# Altium footprint library CryptLib.PcbLib: 52 footprints (part 2 of 4)
Each footprint in its own frame and in the unit in brackets; x right, y up, seen from the top. Pads: shape width x height; smd on the part's side, far side on the other; paste and mask are expansions set on the pad; w line width, h text height; cw(c..) or ccw(c..) is an arc to the next point about the centre after c.
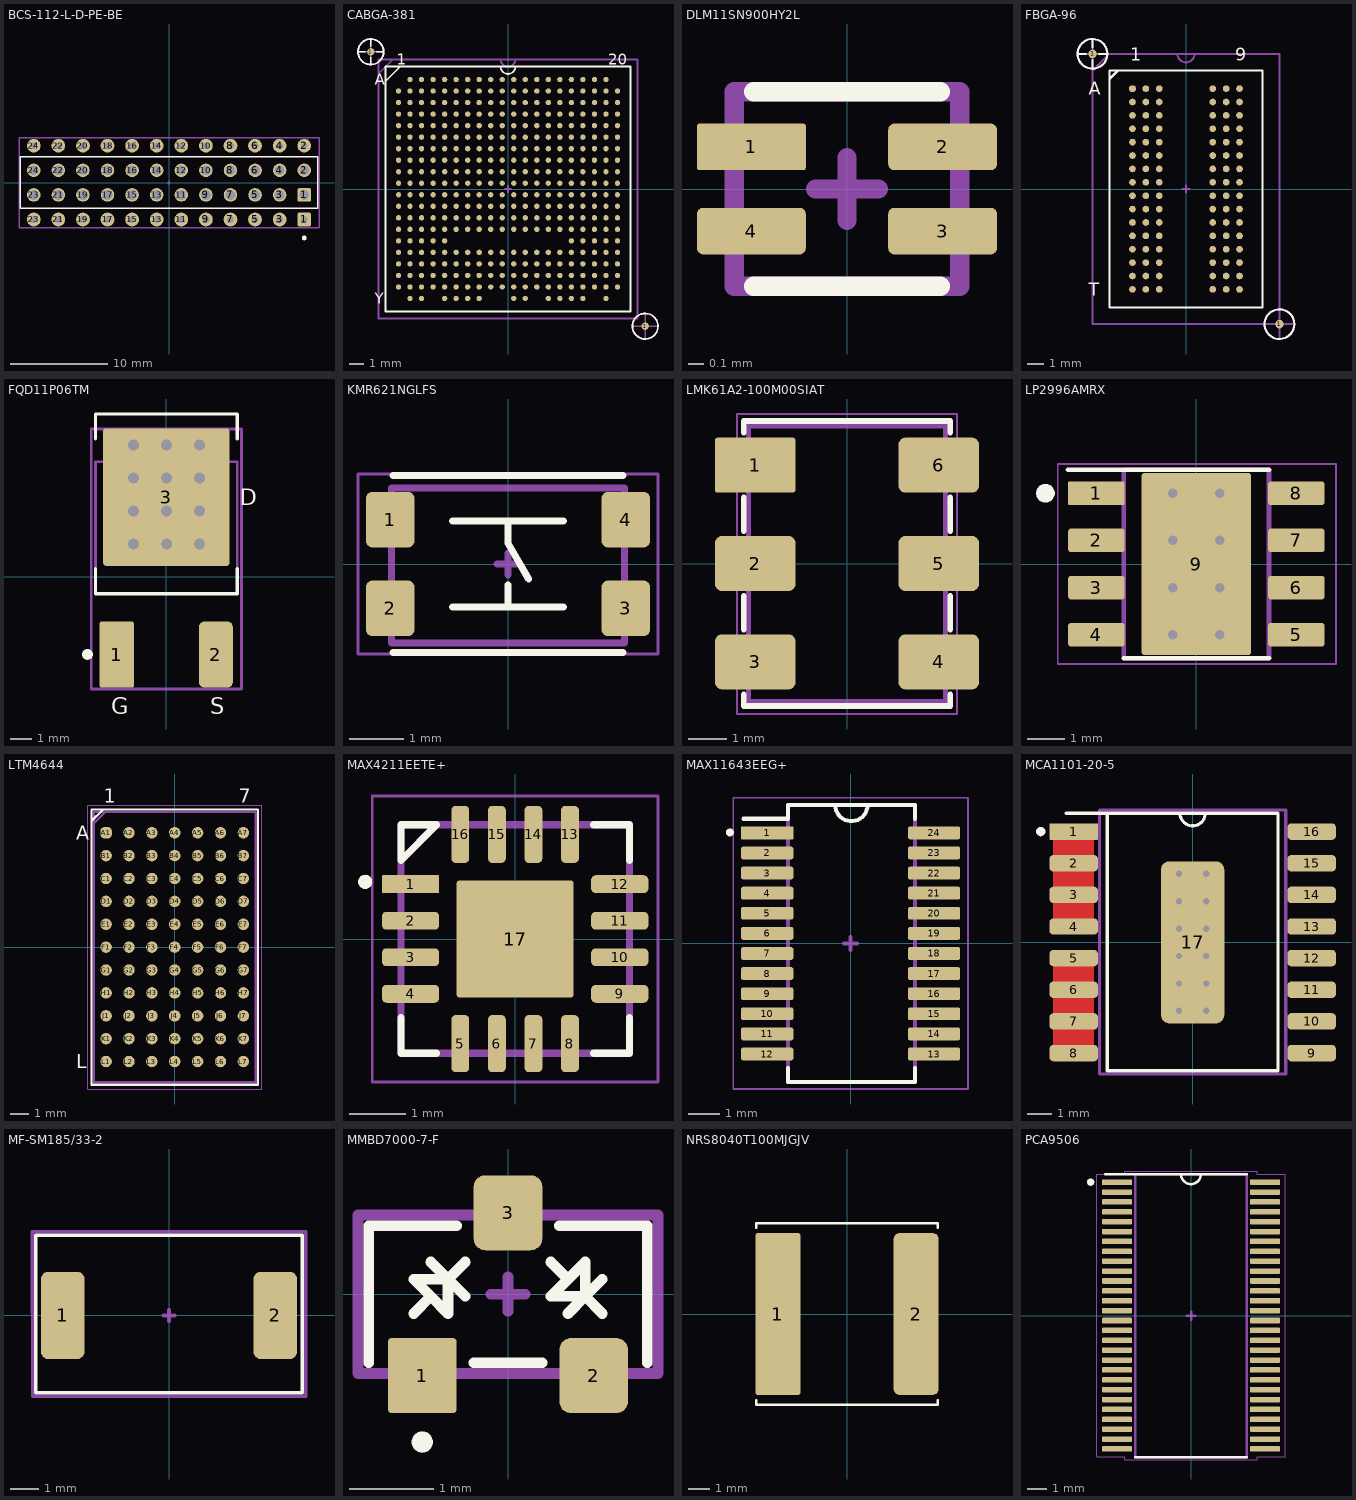
[diagram p1: the footprints below, top view; thin cyan lines are the x and y axes]

## BCS-112-L-D-PE-BE [mil]
pads (50):
  rrect25% 56x56 hole 28 mask+0: 1(550,-150)
  rrect25% 55x55 hole 40 mask+0: 1(550,-50)
  round 55 / inner round 40 / far side round 40 hole 40 mask+0: 2(550,50) 3(450,-50) 4(450,50) 5(350,-50) 6(350,50) 7(250,-50) 8(250,50) 9(150,-50) 10(150,50) 11(50,-50) 12(50,50) 13(-50,-50) 14(-50,50) 15(-150,-50) 16(-150,50) 17(-250,-50) 18(-250,50) 19(-350,-50) 20(-350,50) 21(-450,-50) 22(-450,50) 23(-550,-50) 24(-550,50)
  round 56 / inner round 50 / far side round 50 hole 28 mask+0: 2(550,150) 3(450,-150) 4(450,150) 5(350,-150) 6(350,150) 7(250,-150) 8(250,150) 9(150,-150) 10(150,150) 11(50,-150) 12(50,150) 13(-50,-150) 14(-50,150) 15(-150,-150) 16(-150,150) 17(-250,-150) 18(-250,150) 19(-350,-150) 20(-350,150) 21(-450,-150) 22(-450,150) 23(-550,-150) 24(-550,150)
  round 20 on Top Overlay: ""(550,-225)
  round 7.5 on Mech8: ""(550,-150)
Top Overlay:
  lines w6: -605,-105 -605,105 605,105 605,-105 -605,-105
Top Designator:
  text "'.Designator'" at -113.3,-8.33 h20
Top Assembly:
  lines w5: -8,0 8,0 ; 0,-8 0,8
  lines w6: -610,-183 610,-183 610,183 -610,183 -610,-183
3D body "BCS-112-L-D-PE-BE.stp": height 293.5, standoff -127.5, extent -600.01,-155 599.99,155

## CABGA-381 [mm]
pads (383):
  round 0.508 smd paste-25.375 mask+0.508: 1(-9.525,9.525) 1(9.525,-9.525)
  round 0.37 smd paste-25.375: A2(-6.8,7.6) A3(-6,7.6) A4(-5.2,7.6) A5(-4.4,7.6) A6(-3.6,7.6) A7(-2.8,7.6) A8(-2,7.6) A9(-1.2,7.6) A10(-0.4,7.6) A11(0.4,7.6) A12(1.2,7.6) A13(2,7.6) A14(2.8,7.6) A15(3.6,7.6) A16(4.4,7.6) A17(5.2,7.6) A18(6,7.6) A19(6.8,7.6) B1(-7.6,6.8) B2(-6.8,6.8) B3(-6,6.8) B4(-5.2,6.8) B5(-4.4,6.8) B6(-3.6,6.8) B7(-2.8,6.8) B8(-2,6.8) B9(-1.2,6.8) B10(-0.4,6.8) B11(0.4,6.8) B12(1.2,6.8) B13(2,6.8) B14(2.8,6.8) B15(3.6,6.8) B16(4.4,6.8) B17(5.2,6.8) B18(6,6.8) B19(6.8,6.8) B20(7.6,6.8) C1(-7.6,6) C2(-6.8,6) C3(-6,6) C4(-5.2,6) C5(-4.4,6) C6(-3.6,6) C7(-2.8,6) C8(-2,6) C9(-1.2,6) C10(-0.4,6) C11(0.4,6) C12(1.2,6) C13(2,6) C14(2.8,6) C15(3.6,6) C16(4.4,6) C17(5.2,6) C18(6,6) C19(6.8,6) C20(7.6,6) D1(-7.6,5.2) D2(-6.8,5.2) D3(-6,5.2) D4(-5.2,5.2) D5(-4.4,5.2) D6(-3.6,5.2) D7(-2.8,5.2) D8(-2,5.2) D9(-1.2,5.2) D10(-0.4,5.2) D11(0.4,5.2) D12(1.2,5.2) D13(2,5.2) D14(2.8,5.2) D15(3.6,5.2) D16(4.4,5.2) D17(5.2,5.2) D18(6,5.2) D19(6.8,5.2) D20(7.6,5.2) E1(-7.6,4.4) E2(-6.8,4.4) E3(-6,4.4) E4(-5.2,4.4) E5(-4.4,4.4) E6(-3.6,4.4) E7(-2.8,4.4) E8(-2,4.4) E9(-1.2,4.4) E10(-0.4,4.4) E11(0.4,4.4) E12(1.2,4.4) E13(2,4.4) E14(2.8,4.4) E15(3.6,4.4) E16(4.4,4.4) E17(5.2,4.4) E18(6,4.4) E19(6.8,4.4) E20(7.6,4.4) F1(-7.6,3.6) F2(-6.8,3.6) F3(-6,3.6) F4(-5.2,3.6) F5(-4.4,3.6) F6(-3.6,3.6) F7(-2.8,3.6) F8(-2,3.6) F9(-1.2,3.6) F10(-0.4,3.6) F11(0.4,3.6) F12(1.2,3.6) F13(2,3.6) F14(2.8,3.6) F15(3.6,3.6) F16(4.4,3.6) F17(5.2,3.6) F18(6,3.6) F19(6.8,3.6) F20(7.6,3.6) G1(-7.6,2.8) G2(-6.8,2.8) G3(-6,2.8) G4(-5.2,2.8) G5(-4.4,2.8) G6(-3.6,2.8) G7(-2.8,2.8) G8(-2,2.8) G9(-1.2,2.8) G10(-0.4,2.8) G11(0.4,2.8) G12(1.2,2.8) G13(2,2.8) G14(2.8,2.8) G15(3.6,2.8) G16(4.4,2.8) G17(5.2,2.8) G18(6,2.8) G19(6.8,2.8) G20(7.6,2.8) H1(-7.6,2) H2(-6.8,2) H3(-6,2) H4(-5.2,2) H5(-4.4,2) H6(-3.6,2) H7(-2.8,2) H8(-2,2) H9(-1.2,2) H10(-0.4,2) H11(0.4,2) H12(1.2,2) H13(2,2) H14(2.8,2) H15(3.6,2) H16(4.4,2) H17(5.2,2) H18(6,2) H19(6.8,2) H20(7.6,2) J1(-7.6,1.2) J2(-6.8,1.2) J3(-6,1.2) J4(-5.2,1.2) J5(-4.4,1.2) J6(-3.6,1.2) J7(-2.8,1.2) J8(-2,1.2) J9(-1.2,1.2) J10(-0.4,1.2) J11(0.4,1.2) J12(1.2,1.2) J13(2,1.2) J14(2.8,1.2) J15(3.6,1.2) J16(4.4,1.2) J17(5.2,1.2) J18(6,1.2) J19(6.8,1.2) J20(7.6,1.2) K1(-7.6,0.4) K2(-6.8,0.4) K3(-6,0.4) K4(-5.2,0.4) K5(-4.4,0.4) K6(-3.6,0.4) K7(-2.8,0.4) K8(-2,0.4) K9(-1.2,0.4) K10(-0.4,0.4) K11(0.4,0.4) K12(1.2,0.4) K13(2,0.4) K14(2.8,0.4) K15(3.6,0.4) K16(4.4,0.4) K17(5.2,0.4) K18(6,0.4) K19(6.8,0.4) K20(7.6,0.4) L1(-7.6,-0.4) L2(-6.8,-0.4) L3(-6,-0.4) L4(-5.2,-0.4) L5(-4.4,-0.4) L6(-3.6,-0.4) L7(-2.8,-0.4) L8(-2,-0.4) L9(-1.2,-0.4) L10(-0.4,-0.4) L11(0.4,-0.4) L12(1.2,-0.4) L13(2,-0.4) L14(2.8,-0.4) L15(3.6,-0.4) L16(4.4,-0.4) L17(5.2,-0.4) L18(6,-0.4) L19(6.8,-0.4) L20(7.6,-0.4) M1(-7.6,-1.2) M2(-6.8,-1.2) M3(-6,-1.2) M4(-5.2,-1.2) M5(-4.4,-1.2) M6(-3.6,-1.2) M7(-2.8,-1.2) M8(-2,-1.2) M9(-1.2,-1.2) M10(-0.4,-1.2) M11(0.4,-1.2) M12(1.2,-1.2) M13(2,-1.2) M14(2.8,-1.2) M15(3.6,-1.2) M16(4.4,-1.2) M17(5.2,-1.2) M18(6,-1.2) M19(6.8,-1.2) M20(7.6,-1.2) N1(-7.6,-2) N2(-6.8,-2) N3(-6,-2) N4(-5.2,-2) N5(-4.4,-2) N6(-3.6,-2) N7(-2.8,-2) N8(-2,-2) N9(-1.2,-2) N10(-0.4,-2) N11(0.4,-2) N12(1.2,-2) N13(2,-2) N14(2.8,-2) N15(3.6,-2) N16(4.4,-2) N17(5.2,-2) N18(6,-2) N19(6.8,-2) N20(7.6,-2) P1(-7.6,-2.8) P2(-6.8,-2.8) P3(-6,-2.8) P4(-5.2,-2.8) P5(-4.4,-2.8) P6(-3.6,-2.8) P7(-2.8,-2.8) P8(-2,-2.8) P9(-1.2,-2.8) P10(-0.4,-2.8) P11(0.4,-2.8) P12(1.2,-2.8) P13(2,-2.8) P14(2.8,-2.8) P15(3.6,-2.8) P16(4.4,-2.8) P17(5.2,-2.8) P18(6,-2.8) P19(6.8,-2.8) P20(7.6,-2.8) R1(-7.6,-3.6) R2(-6.8,-3.6) R3(-6,-3.6) R4(-5.2,-3.6) R5(-4.4,-3.6) R16(4.4,-3.6) R17(5.2,-3.6) R18(6,-3.6) R19(6.8,-3.6) R20(7.6,-3.6) T1(-7.6,-4.4) T2(-6.8,-4.4) T3(-6,-4.4) T4(-5.2,-4.4) T5(-4.4,-4.4) T6(-3.6,-4.4) T7(-2.8,-4.4) T8(-2,-4.4) T9(-1.2,-4.4) T10(-0.4,-4.4) T11(0.4,-4.4) T12(1.2,-4.4) T13(2,-4.4) T14(2.8,-4.4) T15(3.6,-4.4) T16(4.4,-4.4) T17(5.2,-4.4) T18(6,-4.4) T19(6.8,-4.4) T20(7.6,-4.4) U1(-7.6,-5.2) U2(-6.8,-5.2) U3(-6,-5.2) U4(-5.2,-5.2) U5(-4.4,-5.2) U6(-3.6,-5.2) U7(-2.8,-5.2) U8(-2,-5.2) U9(-1.2,-5.2) U10(-0.4,-5.2) U11(0.4,-5.2) U12(1.2,-5.2) U13(2,-5.2) U14(2.8,-5.2) U15(3.6,-5.2) U16(4.4,-5.2) U17(5.2,-5.2) U18(6,-5.2) U19(6.8,-5.2) U20(7.6,-5.2) V1(-7.6,-6) V2(-6.8,-6) V3(-6,-6) V4(-5.2,-6) V5(-4.4,-6) V6(-3.6,-6) V7(-2.8,-6) V8(-2,-6) V9(-1.2,-6) V10(-0.4,-6) V11(0.4,-6) V12(1.2,-6) V13(2,-6) V14(2.8,-6) V15(3.6,-6) V16(4.4,-6) V17(5.2,-6) V18(6,-6) V19(6.8,-6) V20(7.6,-6) W1(-7.6,-6.8) W2(-6.8,-6.8) W3(-6,-6.8) W4(-5.2,-6.8) W5(-4.4,-6.8) W6(-3.6,-6.8) W7(-2.8,-6.8) W8(-2,-6.8) W9(-1.2,-6.8) W10(-0.4,-6.8) W11(0.4,-6.8) W12(1.2,-6.8) W13(2,-6.8) W14(2.8,-6.8) W15(3.6,-6.8) W16(4.4,-6.8) W17(5.2,-6.8) W18(6,-6.8) W19(6.8,-6.8) W20(7.6,-6.8) Y2(-6.8,-7.6) Y3(-6,-7.6) Y5(-4.4,-7.6) Y6(-3.6,-7.6) Y7(-2.8,-7.6) Y8(-2,-7.6) Y11(0.4,-7.6) Y12(1.2,-7.6) Y14(2.8,-7.6) Y15(3.6,-7.6) Y16(4.4,-7.6) Y17(5.2,-7.6) Y19(6.8,-7.6)
Top Overlay:
  circle w0.127: c9.525,-9.525 r0.889
  circle w0.127: c-9.525,9.525 r0.889
  lines w0.127: -10.414,9.525 -9.906,9.525 ; -9.525,8.636 -9.525,9.144 ; -9.525,9.906 -9.525,10.414 ; -9.144,9.525 -8.636,9.525 ; -8.5,7.5 -7.5,8.5 ; -0.508,8.5 ccw(c0,8.5) 0.508,8.5 ; -8.5,-8.5 8.5,-8.5 8.5,8.5 -8.5,8.5 -8.5,-8.5
  text "1" at -7.727,8.617 h0.76
  text "A" at -9.254,7.227 h0.76
  text "20" at 6.965,8.617 h0.76
  text "Y" at -9.254,-7.973 h0.76
Top Designator:
  text "'.Designator'" at -2.878,-0.212 h0.51
  text "'.Comment'" at -2.158,-1.515 h0.51
Top Assembly:
  circle w0.127: c9.525,-9.525 r0.889
  circle w0.127: c-9.525,9.525 r0.889
  lines w0.127: -10.414,9.525 -8.636,9.525 ; -9.525,8.636 -9.525,10.414 ; -8.992,7.992 -7.992,8.992 ; -0.508,9 ccw(c0,9) 0.508,9 ; -0.203,0 0.203,0 ; 0,-0.203 0,0.203 ; 8.636,-9.525 10.414,-9.525 ; 9.525,-10.414 9.525,-8.636 ; -9,-9 -9,9 9,9 9,-9 -9,-9
3D body "LFE5UM-45F-8BG381C.STEP": height 0.88, standoff -0.02, extent -8.5,-8.5 8.5,8.5

## DLM11SN900HY2L [mil]
pads (5):
  rrect10% 28x12 smd: 1(-24.61,10.83)
  rrect25% 28x12 smd: 2(24.61,10.83) 3(24.61,-10.83) 4(-24.61,-10.83)
  round 7.5 on Mech8: ""(-24.61,10.83)
Top Overlay:
  lines w5: -24,-25 24,-25 ; -24,25 24,25
Top Designator:
  text "'.Designator'" at -113.3,-8.33 h20
Top Assembly:
  lines w5: -8,0 8,0 ; 0,-8 0,8 ; -29,-25 29,-25 29,25 -29,25 -29,-25
3D body "DLM11SN900HY2L.STEP": height 24.12, standoff 0.5, extent -24.61,-19.68 24.6,19.69

## FBGA-96 [mm]
pads (99):
  round 0.508 smd paste-25.375 mask+0.508: 1(-5.588,8.077) 1(5.588,-8.077)
  rrect75% 0.4x0.4 smd paste-25.375: A1(-3.2,6)
  round 0.4 smd paste-25.375: A2(-2.4,6) A3(-1.6,6) A7(1.6,6) A8(2.4,6) A9(3.2,6) B1(-3.2,5.2) B2(-2.4,5.2) B3(-1.6,5.2) B7(1.6,5.2) B8(2.4,5.2) B9(3.2,5.2) C1(-3.2,4.4) C2(-2.4,4.4) C3(-1.6,4.4) C7(1.6,4.4) C8(2.4,4.4) C9(3.2,4.4) D1(-3.2,3.6) D2(-2.4,3.6) D3(-1.6,3.6) D7(1.6,3.6) D8(2.4,3.6) D9(3.2,3.6) E1(-3.2,2.8) E2(-2.4,2.8) E3(-1.6,2.8) E7(1.6,2.8) E8(2.4,2.8) E9(3.2,2.8) F1(-3.2,2) F2(-2.4,2) F3(-1.6,2) F7(1.6,2) F8(2.4,2) F9(3.2,2) G1(-3.2,1.2) G2(-2.4,1.2) G3(-1.6,1.2) G7(1.6,1.2) G8(2.4,1.2) G9(3.2,1.2) H1(-3.2,0.4) H2(-2.4,0.4) H3(-1.6,0.4) H7(1.6,0.4) H8(2.4,0.4) H9(3.2,0.4) J1(-3.2,-0.4) J2(-2.4,-0.4) J3(-1.6,-0.4) J7(1.6,-0.4) J8(2.4,-0.4) J9(3.2,-0.4) K1(-3.2,-1.2) K2(-2.4,-1.2) K3(-1.6,-1.2) K7(1.6,-1.2) K8(2.4,-1.2) K9(3.2,-1.2) L1(-3.2,-2) L2(-2.4,-2) L3(-1.6,-2) L7(1.6,-2) L8(2.4,-2) L9(3.2,-2) M1(-3.2,-2.8) M2(-2.4,-2.8) M3(-1.6,-2.8) M7(1.6,-2.8) M8(2.4,-2.8) M9(3.2,-2.8) N1(-3.2,-3.6) N2(-2.4,-3.6) N3(-1.6,-3.6) N7(1.6,-3.6) N8(2.4,-3.6) N9(3.2,-3.6) P1(-3.2,-4.4) P2(-2.4,-4.4) P3(-1.6,-4.4) P7(1.6,-4.4) P8(2.4,-4.4) P9(3.2,-4.4) R1(-3.2,-5.2) R2(-2.4,-5.2) R3(-1.6,-5.2) R7(1.6,-5.2) R8(2.4,-5.2) R9(3.2,-5.2) T1(-3.2,-6) T2(-2.4,-6) T3(-1.6,-6) T7(1.6,-6) T8(2.4,-6) T9(3.2,-6)
  round 0.191 on Mech8: ""(-3.2,6)
Top Overlay:
  circle w0.127: c5.588,-8.077 r0.889
  circle w0.127: c-5.588,8.077 r0.889
  lines w0.127: -6.477,8.077 -5.969,8.077 ; -5.588,7.188 -5.588,7.696 ; -5.588,8.458 -5.588,8.966 ; -5.207,8.077 -4.699,8.077 ; -4.572,6.579 -4.064,7.087 ; -4.572,-7.087 4.572,-7.087 4.572,7.087 -4.572,7.087 -4.572,-7.087
  text "A" at -5.804,5.627 h0.76
  text "1" at -3.327,7.667 h0.76
  text "T" at -5.804,-6.383 h0.76
  text "9" at 2.946,7.667 h0.76
Top Designator:
  text "'.Comment'" at -2.158,-1.541 h0.51
  text "'.Designator'" at -2.878,-0.212 h0.51
Top Assembly:
  circle w0.127: c5.588,-8.077 r0.889
  circle w0.127: c-5.588,8.077 r0.889
  lines w0.127: -6.477,8.077 -4.699,8.077 ; -5.588,7.077 -4.588,8.077 ; -5.588,7.188 -5.588,8.966 ; -0.508,8.077 ccw(c0,8.077) 0.508,8.077 ; -0.203,0 0.203,0 ; 0,-0.203 0,0.203 ; 4.699,-8.077 6.477,-8.077 ; 5.588,-8.966 5.588,-7.188 ; -5.588,-8.077 5.588,-8.077 5.588,8.077 -5.588,8.077 -5.588,-8.077
3D body "User Library-96-FBGA (14X9).step": height 1.11, standoff 0.01, extent -4.5,-7 4.5,7

## FQD11P06TM [mil]
pads (5):
  rrect10% 62x120 smd: 1(-90,-141)
  rrect33% 62x120 smd: 2(90,-141)
  rrect5% 230x250 smd paste-999: 3(0,145)
  round 20 on Top Overlay: ""(-143.31,-140.74)
  round 7.5 on Mech8: ""(-90,-141)
via -60,240 diameter 40 hole 20
via 60,240 diameter 40 hole 20
via 60,120 diameter 40 hole 20
via -60,120 diameter 40 hole 20
via 60,60 diameter 40 hole 20
via 0,60 diameter 40 hole 20
via -60,60 diameter 40 hole 20
via 0,120 diameter 40 hole 20
via 0,240 diameter 40 hole 20
via 0,180 diameter 40 hole 20
via 60,180 diameter 40 hole 20
via -60,180 diameter 40 hole 20
Top Overlay:
  lines w5.91: -128.74,14.66 -128.74,-30.5 128.74,-30.5 128.74,14.66 ; -128.74,250.84 -128.74,296 128.74,296 128.74,250.84
  text "G" at -100,-249 h30
  text "S" at 80,-249 h30
  text "D" at 133,130 h30
Top Paste:
  rectangle: 35,25 85,35
  rectangle: -25,25 25,35
  rectangle: -85,25 -35,35
  rectangle: 35,85 85,95
  rectangle: -25,85 25,95
  rectangle: -85,85 -35,95
  rectangle: 35,145 85,155
  rectangle: -25,145 25,155
  rectangle: -85,145 -35,155
  rectangle: 35,205 85,215
  rectangle: -25,205 25,215
  rectangle: -85,205 -35,215
  rectangle: -110,25 -85,265
  rectangle: 85,25 110,265
  rectangle: -35,25 -25,265
  rectangle: 25,25 35,265
Top Designator:
  text "'.Designator'" at -113.3,-8.33 h20
Top Assembly:
  lines w5: -13,52 13,52 ; 0,39 0,65 ; -136.42,-203.72 136.42,-203.72 136.42,268.71 -136.42,268.71 -136.42,-203.72 ; -128.74,-30.5 -128.74,209.47 128.74,209.47 128.74,-30.5 -128.74,-30.5
3D body "User Library-DPAK-1.step": height 90.46, standoff -4.62, extent -128.74,-176.76 128.74,214.51

## KMR621NGLFS [mil]
height 75
pads (5):
  rrect25% 35x40 smd: 1(-85,32) 2(-85,-32) 3(85,-32) 4(85,32)
  round 7.5 on Mech8: ""(-85,32)
Top Overlay:
  lines w5: -83,-64 83,-64 ; -83,64 83,64 ; -40,-31 40,-31 ; -40,31 40,31 ; 0,-31 0,-15 ; 0,31 0,15 15,-10.98
Top Designator:
  text "'.Designator'" at -113.3,-8.33 h20
Top Assembly:
  lines w5: -8,0 8,0 ; 0,-8 0,8 ; -84,-57 84,-57 84,55 -84,55 -84,-57
Top Courtyard (Mech10):
  lines w2: -108.27,-64.96 108.27,-64.96 108.27,64.96 -108.27,64.96 -108.27,-64.96
3D body "KMR621NG LFS--3DModel-STEP-56544.STEP": height 75.3, standoff 0.5, extent -92.55,-55.12 88.55,55.12

## LMK61A2-100M00SIAT [mil] "QFM-6 (7x5)"
height 45
pads (7):
  rrect10% 82x56 smd: 1(-93.33,100)
  rrect25% 82x56 smd: 2(-93.33,0) 3(-93.33,-100) 4(93.33,-100) 5(93.33,0) 6(93.33,100)
  round 7.5 on Mech8: ""(-93.33,100)
Top Overlay:
  lines w6: -105,-133 -105,-145 105,-145 105,-133 ; -105,-67 -105,-33 ; -105,33 -105,67 ; -105,133 -105,145 105,145 105,133 ; 105,-67 105,-33 ; 105,33 105,67
Top Designator:
  text "'.Designator'" at -113.3,-8.33 h20
Top Assembly:
  lines w5: -100,-140 -100,140 100,140 100,-140 -100,-140
Top Courtyard (Mech10):
  lines w2: -112,-153 -112,152 112,152 112,-153 -112,-153
3D body "SIA6_TEX.step": height 45.12, standoff 0, extent -100.51,-140 100.51,140

## LP2996AMRX [mil]
pads (11):
  rrect10% 60x25 smd: 1(-106,75)
  rrect25% 60x25 smd: 2(-106,25) 3(-106,-25) 4(-106,-75) 5(106,-75) 6(106,-25) 7(106,25) 8(106,75)
  rrect5% 116.14x192.91 smd paste-118.11 mask+0: 9(0,0)
  round 20 on Top Overlay: ""(-160,75)
  round 7.5 on Mech8: ""(-106,75)
via -25,25 diameter 20 hole 10
via -25,75 diameter 20 hole 10
via -25,-25 diameter 20 hole 10
via -25,-75 diameter 20 hole 10
via 25,-25 diameter 20 hole 10
via 25,-75 diameter 20 hole 10
via 25,25 diameter 20 hole 10
via 25,75 diameter 20 hole 10
Top Overlay:
  lines w5: -136,100 77,100 ; -77,-100 77,-100
Top Paste:
  region: 53.35,-66.93 -53.35,-66.93 -53.35,66.93 53.35,66.93
Top Designator:
  text "'.Designator'" at -113.3,-8.33 h20
Top Assembly:
  lines w5: -8,0 8,0 ; 0,-8 0,8 ; -77,-100 -77,100 77,100 77,-100 -77,-100
Top Courtyard (Mech10):
  lines w2: -147,-106 148,-106 148,106 -147,106 -147,-106
3D body "LP2996.STEP": height 67.43, standoff 0.5, extent -118.11,-96.46 118.11,96.45

## LTM4644 [mil] "77-BGA (15 x 9)"
height 200
pads (78):
  rrect75% 25x25 smd: A1(-150,250)
  round 25 smd: A2(-100,250) A3(-50,250) A4(0,250) A5(50,250) A6(100,250) A7(150,250) B1(-150,200) B2(-100,200) B3(-50,200) B4(0,200) B5(50,200) B6(100,200) B7(150,200) C1(-150,150) C2(-100,150) C3(-50,150) C4(0,150) C5(50,150) C6(100,150) C7(150,150) D1(-150,100) D2(-100,100) D3(-50,100) D4(0,100) D5(50,100) D6(100,100) D7(150,100) E1(-150,50) E2(-100,50) E3(-50,50) E4(0,50) E5(50,50) E6(100,50) E7(150,50) F1(-150,0) F2(-100,0) F3(-50,0) F4(0,0) F5(50,0) F6(100,0) F7(150,0) G1(-150,-50) G2(-100,-50) G3(-50,-50) G4(0,-50) G5(50,-50) G6(100,-50) G7(150,-50) H1(-150,-100) H2(-100,-100) H3(-50,-100) H4(0,-100) H5(50,-100) H6(100,-100) H7(150,-100) J1(-150,-150) J2(-100,-150) J3(-50,-150) J4(0,-150) J5(50,-150) J6(100,-150) J7(150,-150) K1(-150,-200) K2(-100,-200) K3(-50,-200) K4(0,-200) K5(50,-200) K6(100,-200) K7(150,-200) L1(-150,-250) L2(-100,-250) L3(-50,-250) L4(0,-250) L5(50,-250) L6(100,-250) L7(150,-250)
  round 7.5 on Mech8: ""(-150,250)
Top Overlay:
  lines w5: -182,275.5 -157,300.5 ; -182,-301 182,-301 182,301 -182,301 -182,-301
  text "L" at -215,-265 h30
  text "A" at -215,235 h30
  text "1" at -155,315.63 h30
  text "7" at 140,315.63 h30
Top Designator:
  text "'.Designator'" at -113.3,-8.33 h20
Top Assembly:
  lines w5: -177,270.5 -152,295.5 ; -8,0 8,0 ; 0,-8 0,8 ; -177,-295.5 177,-295.5 177,295.5 -177,295.5 -177,-295.5
Top Courtyard (Mech10):
  lines w2: -190,-310 -190,310 190,310 190,-310 -190,-310
3D body "User Library-LinearTech BGA77.STEP": height 200.53, standoff -1.05, extent -177.17,-295.28 177.17,295.28

## MAX4211EETE+ [mil] "QFN-16 4x4"
height 30
pads (19):
  rrect10% 40x12.5 smd: 1(-73.23,38.39)
  rrect50% 40x12.5 smd: 2(-73.23,12.8) 3(-73.23,-12.8) 4(-73.23,-38.39) 9(73.23,-38.39) 10(73.23,-12.8) 11(73.23,12.8) 12(73.23,38.39)
  rrect50% 12.5x40 smd: 5(-38.39,-73.23) 6(-12.8,-73.23) 7(12.8,-73.23) 8(38.39,-73.23) 13(38.39,73.23) 14(12.8,73.23) 15(-12.8,73.23) 16(-38.39,73.23)
  rrect5% 82x82 smd paste-78.74: 17(0,0)
  round 10 on Top Overlay: ""(-105,40)
  round 7.5 on Mech8: ""(-73.23,38.39)
Top Overlay:
  lines w5: -80,-55 -80,-80 -55,-80 ; 55,-80 80,-80 80,-55 ; 55,80 80,80 80,55 ; -80,55 -55,80 -80,80 -80,55
Top Paste:
  region: 25.98,-25.98 -25.98,-25.98 -25.98,25.98 25.98,25.98
Top Designator:
  text "'.Designator'" at -113.3,-8.33 h20
Top Assembly:
  lines w5: -80,55 -55,80 ; -8,0 8,0 ; 0,-8 0,8 ; -80,-80 -80,80 80,80 80,-80 -80,-80
Top Courtyard (Mech10):
  lines w2: -100,-100 -100,100 100,100 100,-100 -100,-100
3D body "User Library-qfn16-4x4.step": height 36.22, standoff 0, extent -78.74,-78.74 78.74,78.74

## MAX11643EEG+ [mil] "SSOP-24"
pads (26):
  rrect10% 65x16 smd: 1(-103.74,137.5)
  rrect33% 65x16 smd: 2(-103.74,112.5) 3(-103.74,87.5) 4(-103.74,62.5) 5(-103.74,37.5) 6(-103.74,12.5) 7(-103.74,-12.5) 8(-103.74,-37.5) 9(-103.74,-62.5) 10(-103.74,-87.5) 11(-103.74,-112.5) 12(-103.74,-137.5) 13(103.74,-137.5) 14(103.74,-112.5) 15(103.74,-87.5) 16(103.74,-62.5) 17(103.74,-37.5) 18(103.74,-12.5) 19(103.74,12.5) 20(103.74,37.5) 21(103.74,62.5) 22(103.74,87.5) 23(103.74,112.5) 24(103.74,137.5)
  round 10 on Top Overlay: ""(-150,138)
  round 7.5 on Mech8: ""(-103.74,137.5)
Top Overlay:
  lines w5: -133,155 -78,155 -78,172 80,172 80,155 ; -78,-155 -78,-172 79,-172 ; -19,172 ccw(c1,172) 21,172 ; 80,-172 80,-155
Top Designator:
  text "'.Designator'" at -113.3,-8.33 h20
Top Assembly:
  lines w5: -8,0 8,0 ; 0,-8 0,8 ; -78,-172 80,-172 80,172 -78,172 -78,-172
Top Courtyard (Mech10):
  lines w2: -146,-181 146,-181 146,181 -146,181 -146,-181
3D body "MAX11643EEG+.STEP": height 69.4, standoff 0.5, extent -118.5,-170.28 118.5,170.28

## MCA1101-20-5 [mil] "SOIC-16 Current Sensor"
height 103.94
pads (19):
  rrect10% 77x26 smd: 1(-188,175)
  rrect50% 77x26 smd: 2(-188,125) 3(-188,75) 4(-188,25) 5(-188,-25) 6(-188,-75) 7(-188,-125) 8(-188,-175) 9(188,-175) 10(188,-125) 11(188,-75) 12(188,-25) 13(188,25) 14(188,75) 15(188,125) 16(188,175)
  rrect25% 100x256 smd: 17(0,0)
  round 15 on Top Overlay: ""(-240,175)
  round 7.5 on Mech8: ""(-188,175)
via -21.65,108.27 diameter 25 hole 10
via 21.65,108.27 diameter 25 hole 10
via -21.65,64.96 diameter 25 hole 10
via 21.65,64.96 diameter 25 hole 10
via -21.65,21.65 diameter 25 hole 10
via 21.65,21.65 diameter 25 hole 10
via -21.65,-21.65 diameter 25 hole 10
via 21.65,-21.65 diameter 25 hole 10
via -21.65,-64.96 diameter 25 hole 10
via 21.65,-64.96 diameter 25 hole 10
via -21.65,-108.27 diameter 25 hole 10
via 21.65,-108.27 diameter 25 hole 10
Top Layer:
  region: -220,182 -220,18 -156,18 -156,182
  region: -220,-18 -220,-182 -156,-182 -156,-18
Top Overlay:
  lines w5: -200,204 -135,204 ; -20,204 ccw(c0,204) 20,204 ; -135,204 -135,-203 135,-203 135,204 -135,204
Top Designator:
  text "'.Designator'" at -113.3,-8.33 h20
Top Assembly:
  lines w5: -8,0 8,0 ; 0,-8 0,8 ; -147,-208 147,-208 147,209 -147,209 -147,-208
3D body "MCA1101-20-5.step": height 103.94, standoff 0, extent -200.98,-202.76 200.98,202.76

## MF-SM185/33-2 [mil]
pads (3):
  rrect33% 60x120 smd: 1(-146,0) 2(146,0)
  round 7.5 on Mech8: ""(-146,0)
Top Overlay:
  lines w5: -183,-106 -183,-18 -183,110 183,110 183,-106 -183,-106
Top Designator:
  text "'.Designator'" at -113.3,-8.33 h20
Top Assembly:
  lines w5: -8,0 8,0 ; 0,-8 0,8 ; -188,115 188,115 188,-111 -187,-111 -188,115
3D body "User Library-SMD100F.step": height 119.19, standoff 1.08, extent -157.48,-98 157.48,98.85

## MMBD7000-7-F [mil]
pads (5):
  rrect10% 32x35 smd: 1(-40,-38)
  rrect33% 32x35 smd: 2(40,-38) 3(0,38)
  round 10 on Top Overlay: ""(-40,-69)
  round 7.5 on Mech8: ""(-40,-38)
Top Overlay:
  lines w5: -65,-32 -65,32 -24,32 ; -44,-9 -36,-1 ; -36,15 -28,7 ; -20,-1 -28,7 ; -20,15 -28,7 ; -16,-32 16,-32 ; 20,15 28,7 ; 24,32 65,32 65,-32 ; 28,-9 36,-1 ; 44,-9 36,-1 ; 44,7 36,-1 ; -36,-1 -44,7 -28,7 ; -36,-1 -28,-9 -28,7 ; 28,7 20,-1 36,-1 ; 28,7 36,15 36,-1
Top Designator:
  text "'.Designator'" at -113.3,-8.33 h20
Top Assembly:
  lines w5: -8,0 8,0 ; 0,-8 0,8 ; -70,-37 70,-37 70,37 -70,37 -70,-37
3D body "User Library-sot-3p290x130ll237h100.step": height 39.57, standoff 0, extent -57.09,-46.64 57.08,46.66

## NRS8040T100MJGJV [mil]
pads (3):
  rrect10% 83x300 smd: 1(-128,0)
  rrect25% 83x300 smd: 2(128,0)
  round 7.5 on Mech8: ""(-128,0)
Top Overlay:
  lines w5: -168,-160 -168,-168 168,-168 168,-160 ; -168,160 -168,168 168,168 168,160
Top Designator:
  text "'.Designator'" at -113.3,-8.33 h20
3D body "IND_NRS8040_TAY.step": height 165.12, standoff 0, extent -161.49,-161.49 161.5,161.5

## PCA9506 [mil] "TSSOP-56"
height 40
pads (58):
  rrect10% 60x11 smd: 1(-147.5,265.75)
  rrect33% 60x11 smd: 2(-147.5,246.06) 3(-147.5,226.38) 4(-147.5,206.69) 5(-147.5,187.01) 6(-147.5,167.32) 7(-147.5,147.64) 8(-147.5,127.95) 9(-147.5,108.27) 10(-147.5,88.58) 11(-147.5,68.9) 12(-147.5,49.21) 13(-147.5,29.53) 14(-147.5,9.84) 15(-147.5,-9.84) 16(-147.5,-29.53) 17(-147.5,-49.21) 18(-147.5,-68.9) 19(-147.5,-88.58) 20(-147.5,-108.27) 21(-147.5,-127.95) 22(-147.5,-147.64) 23(-147.5,-167.32) 24(-147.5,-187.01) 25(-147.5,-206.69) 26(-147.5,-226.38) 27(-147.5,-246.06) 28(-147.5,-265.75) 29(147.5,-265.75) 30(147.5,-246.06) 31(147.5,-226.38) 32(147.5,-206.69) 33(147.5,-187.01) 34(147.5,-167.32) 35(147.5,-147.64) 36(147.5,-127.95) 37(147.5,-108.27) 38(147.5,-88.58) 39(147.5,-68.9) 40(147.5,-49.21) 41(147.5,-29.53) 42(147.5,-9.84) 43(147.5,9.84) 44(147.5,29.53) 45(147.5,49.21) 46(147.5,68.9) 47(147.5,88.58) 48(147.5,108.27) 49(147.5,127.95) 50(147.5,147.64) 51(147.5,167.32) 52(147.5,187.01) 53(147.5,206.69) 54(147.5,226.38) 55(147.5,246.06) 56(147.5,265.75)
  round 15 on Top Overlay: ""(-200,266)
  round 7.5 on Mech8: ""(-147.5,265.75)
Top Overlay:
  lines w5: -171,282 110.79,282 ; -110.79,-282 110.79,-282 ; -20.1,282 ccw(c-0.1,282) 19.9,282
Top Designator:
  text "'.Designator'" at -113.3,-8.33 h20
Top Assembly:
  lines w5: -8,0 8,0 ; 0,-8 0,8 ; -111,-282 -111,282 111,282 111,-282 -111,-282
Top Courtyard (Mech10):
  lines w2: -187.5,-281.25 -132,-281.25 -132,-287.5 132,-287.5 132,-281.25 187.5,-281.25 187.5,281.25 132,281.25 132,287.5 -132,287.5 -132,281.25 -187.5,281.25 -187.5,-281.25
3D body "SOT364-1_NXP.step": height 47.09, standoff 0, extent -163.5,-277.48 163.5,277.48